# Altium footprint library Vowstar_Connector.PcbLib: 127 footprints (part 1 of 8)
Each footprint in its own frame and in the unit in brackets; x right, y up, seen from the top. Pads: shape width x height; smd on the part's side, far side on the other; paste and mask are expansions set on the pad; w line width, h text height; cw(c..) or ccw(c..) is an arc to the next point about the centre after c.
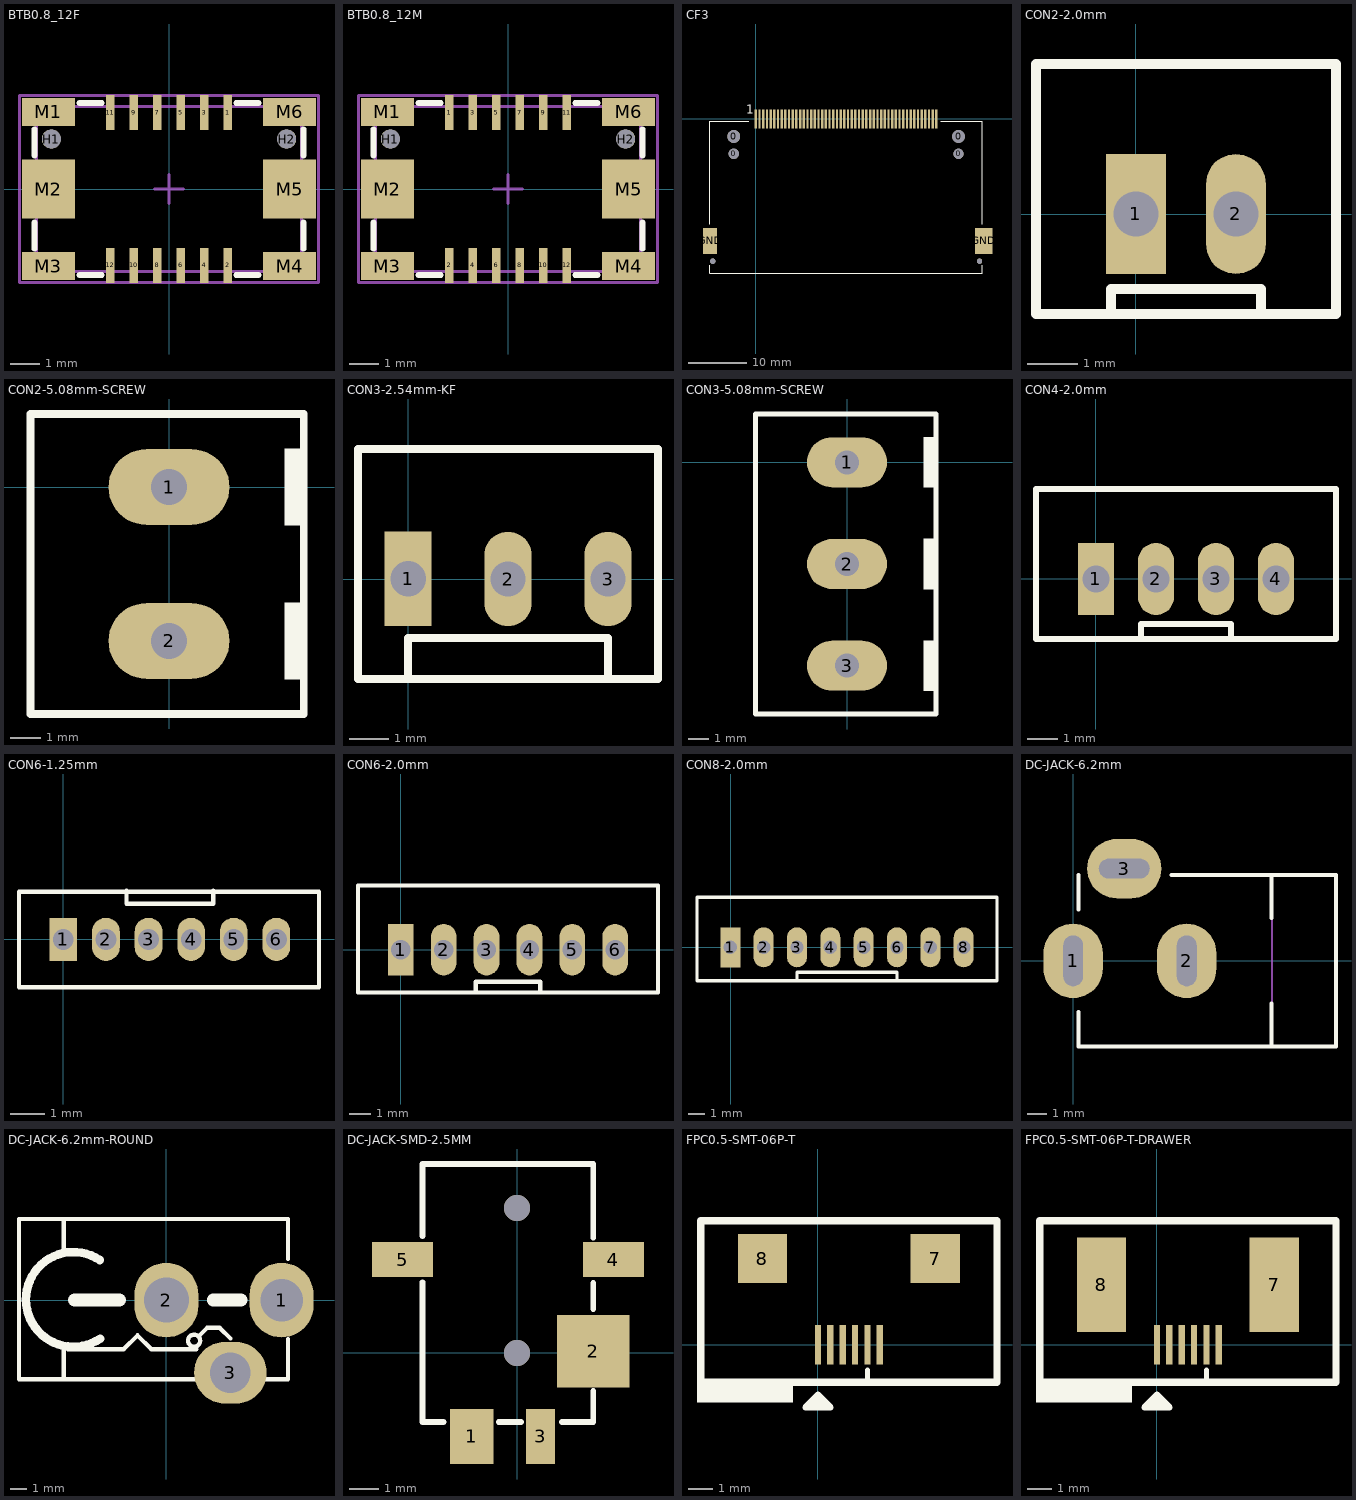
[diagram p0: the footprints below, top view; thin cyan lines are the x and y axes]

## BTB0.8_12F [mm] "BTB0.8-12M/F-6.0LG"
height 3.35
pads (20):
  rect 0.3x1.2 smd: 1(2,2.6) 2(2,-2.6) 3(1.2,2.6) 4(1.2,-2.6) 5(0.4,2.6) 6(0.4,-2.6) 7(-0.4,2.6) 8(-0.4,-2.6) 9(-1.2,2.6) 10(-1.2,-2.6) 11(-2,2.6) 12(-2,-2.6)
  round 0.65 hole 0.65 unplated mask-1: H1(-4,1.7) H2(4,1.7)
  rect 1.8x0.95 smd: M1(-4.1,2.625) M3(-4.1,-2.625) M4(4.1,-2.625) M6(4.1,2.625)
  rect 1.8x2 smd: M2(-4.1,0) M5(4.1,0)
Top Overlay:
  lines w0.2: -4.572,-2.032 -4.572,-1.143 ; -4.572,1.143 -4.572,2.032 ; -3.048,-2.921 -2.286,-2.921 ; -3.048,2.921 -2.286,2.921 ; 2.286,-2.921 3.048,-2.921 ; 2.286,2.921 3.048,2.921 ; 4.572,-2.032 4.572,-1.143 ; 4.572,1.143 4.572,2.032
Mechanical 13:
  lines w0.1: -4.5,-2.8 4.5,-2.8 4.5,2.8 -4.5,2.8 -4.5,-2.8
Mechanical 15:
  lines w0.1: -0.5,0 0.5,0 ; 0,-0.5 0,0.5 ; -5.08,-3.175 5.08,-3.175 5.08,3.175 -5.08,3.175 -5.08,-3.175
3D body "BTB0.8_12F.STEP": height 2.35, standoff -0.55, extent -4.5,-2.85 4.5,2.85

## BTB0.8_12M [mm] "BTB0.8-12M/F-6.0LG"
height 3.35
pads (20):
  rect 0.3x1.2 smd: 1(-2,2.6) 2(-2,-2.6) 3(-1.2,2.6) 4(-1.2,-2.6) 5(-0.4,2.6) 6(-0.4,-2.6) 7(0.4,2.6) 8(0.4,-2.6) 9(1.2,2.6) 10(1.2,-2.6) 11(2,2.6) 12(2,-2.6)
  round 0.65 hole 0.65 unplated mask-1: H1(-4,1.7) H2(4,1.7)
  rect 1.8x0.95 smd: M1(-4.1,2.625) M3(-4.1,-2.625) M4(4.1,-2.625) M6(4.1,2.625)
  rect 1.8x2 smd: M2(-4.1,0) M5(4.1,0)
Top Overlay:
  lines w0.2: -4.572,-2.032 -4.572,-1.143 ; -4.572,1.143 -4.572,2.032 ; -3.048,-2.921 -2.286,-2.921 ; -3.048,2.921 -2.286,2.921 ; 2.286,-2.921 3.048,-2.921 ; 2.286,2.921 3.048,2.921 ; 4.572,-2.032 4.572,-1.143 ; 4.572,1.143 4.572,2.032
Mechanical 13:
  lines w0.1: -4.5,-2.8 -4.5,2.8 4.5,2.8 4.5,-2.8 -4.5,-2.8
Mechanical 15:
  lines w0.1: -0.5,0 0.5,0 ; 0,-0.5 0,0.5 ; -5.08,-3.175 -5.08,3.175 5.08,3.175 5.08,-3.175 -5.08,-3.175
3D body "BTB0.8_12M.STEP": height 2.35, standoff -0.55, extent -4.5,-2.85 4.5,2.85

## CF3 [mm]
pads (58):
  round 0.9 hole 0.9 unplated: 0(-7.44,-24.504) 0(38.56,-24.504)
  round 1.75 hole 1.75 unplated: 0(-3.81,-6.004) 0(34.925,-6.004)
  round 2.2 hole 2.2 unplated: 0(-3.81,-3.004) 0(34.925,-3.004)
  rect 0.4x3.302 smd: 1(0,0) 2(1.27,0) 3(2.54,0) 4(3.81,0) 5(5.08,0) 6(6.35,0) 7(7.62,0) 8(8.89,0) 9(10.16,0) 10(11.43,0) 11(12.7,0) 12(13.97,0) 13(15.24,0) 14(16.51,0) 15(17.78,0) 16(19.05,0) 17(20.32,0) 18(21.59,0) 19(22.86,0) 20(24.13,0) 21(25.4,0) 22(26.67,0) 23(27.94,0) 24(29.21,0) 25(30.48,0) 26(0.635,0) 27(1.905,0) 28(3.175,0) 29(4.445,0) 30(5.715,0) 31(6.985,0) 32(8.255,0) 33(9.525,0) 34(10.795,0) 35(12.065,0) 36(13.335,0) 37(14.605,0) 38(15.875,0) 39(17.145,0) 40(18.415,0) 41(19.685,0) 42(20.955,0) 43(22.225,0) 44(23.495,0) 45(24.765,0) 46(26.035,0) 47(27.305,0) 48(28.575,0) 49(29.845,0) 50(31.115,0)
  rect 2.4x4.5 smd: GND(-7.9,-21.004)
  rect 3x4.5 smd: GND(39.31,-21.004)
Top Overlay:
  lines w0.152: -7.94,-0.404 -1.225,-0.404 ; 31.85,-0.404 39.06,-0.404
  lines w0.203: -7.94,-25.237 -7.94,-26.604 39.06,-26.604 39.06,-25.237 ; -7.94,-18.171 -7.94,-0.404 ; 39.06,-18.171 39.06,-0.404
  text "1" at -1.7,0.946 h1.52

## CON2-2.0mm [mm]
pads (2):
  rect 1.2x2.4 hole 0.9: 1(0.002,0.002)
  oval 1.2x2.4 hole 0.9: 2(2.002,0.002)
Top Overlay:
  lines w0.2: -0.498,-1.998 -0.498,-1.498 2.502,-1.498 2.502,-1.998 ; -1.998,-1.998 4.002,-1.998 4.002,3.002 -1.998,3.002 -1.998,-1.998
3D body: height 1.5, standoff 0, extent -1.905,-2.032 3.937,2.921
3D body: height 2, standoff 0, extent -0.508,-2.032 2.54,-1.905
3D body: height 5, standoff 0, extent 2.413,-2.032 4.064,-1.905
3D body: height 5, standoff 0, extent -2.032,-2.032 -0.381,-1.905
3D body: height 4, standoff -1, extent 1.778,-0.254 2.286,0.254
3D body: height 4, standoff -1, extent -0.254,-0.254 0.254,0.254
3D body: height 5, standoff 0, extent -2.032,2.921 4.064,3.048
3D body: height 5, standoff 0, extent 3.937,-1.905 4.064,3.048
3D body: height 5, standoff 0, extent -2.032,-1.905 -1.905,3.048

## CON2-5.08mm-SCREW [mm] "CON2-5.08mm-SCREW"
pads (2):
  oval 4x2.5 hole 1.2: 1(0,0) 2(0,-5.08)
Top Overlay:
  rectangle: 3.81,-6.35 4.572,-3.81
  rectangle: 3.81,-1.27 4.572,1.27
  lines w0.254: -4.572,-7.493 4.445,-7.493 4.445,2.413 -4.572,2.413 -4.572,-7.493
3D body "User Library-2 Way PCB Screw Terminal Block 5.08mm.STEP": height 15.2, standoff -3.5, extent -4.555,-7.54 4.445,2.46

## CON3-2.54mm-KF [mm]
pads (3):
  rect 1.2x2.4 hole 0.9: 1(0.002,0.002)
  oval 1.2x2.4 hole 0.9: 2(2.54,0) 3(5.08,0)
Top Overlay:
  lines w0.2: 0,-2.54 0,-1.498 5.08,-1.498 5.08,-2.54 ; -1.27,-2.54 -1.27,3.302 6.35,3.302 6.35,-2.54 -1.27,-2.54
3D body "Fan_connector(3pin).STEP": height 11.4, standoff -2, extent -1.25,-2.533 6.35,3.267

## CON3-5.08mm-SCREW [mm] "CON3-5.08mm-SCREW"
pads (3):
  oval 4x2.5 hole 1.2: 1(0,0) 2(0,-5.08) 3(0,-10.16)
Top Overlay:
  rectangle: 3.81,-11.43 4.572,-8.89
  rectangle: 3.81,-1.27 4.572,1.27
  rectangle: 3.81,-6.35 4.572,-3.81
  lines w0.254: -4.572,-12.573 -4.572,2.413 4.445,2.413 4.445,-12.573 -4.572,-12.573
3D body "User Library-3 Way PCB Screw Terminal Block 5.08mm.STEP": height 15.2, standoff -3.5, extent -4.555,-12.54 4.445,2.46

## CON4-2.0mm [mm]
pads (4):
  rect 1.2x2.4 hole 0.9: 1(0,0)
  oval 1.2x2.4 hole 0.9: 2(2,0) 3(4,0) 4(6,0)
Top Overlay:
  lines w0.2: 1.5,-2 1.5,-1.5 4.5,-1.5 4.5,-2 ; -2,-2 8,-2 8,3 -2,3 -2,-2

## CON6-1.25mm [mil]
pads (6):
  rect 32x50 hole 24: 1(0,0)
  oval 32x50 hole 24: 2(49.21,0) 3(98.42,0) 4(147.64,0) 5(196.85,0) 6(246.06,0)
Top Overlay:
  lines w5: 73.03,56.06 73.03,41.06 173.03,41.06 173.03,56.06 ; -51.18,-55.12 -51.18,55.12 295.28,55.12 295.28,-55.12 -51.18,-55.12

## CON6-2.0mm [mm]
pads (6):
  rect 1.2x2.4 hole 0.9: 1(0.008,0.002)
  oval 1.2x2.4 hole 0.9: 2(2.008,0.002) 3(4.008,0.002) 4(6.008,0.002) 5(8.008,0.002) 6(10.008,0.002)
Top Overlay:
  lines w0.2: 3.508,-1.998 3.508,-1.498 6.508,-1.498 6.508,-1.998 ; -1.992,-1.998 -1.992,3.002 12.008,3.002 12.008,-1.998 -1.992,-1.998

## CON8-2.0mm [mm]
pads (8):
  rect 1.2x2.4 hole 0.8: 1(-0.012,-0.002)
  oval 1.2x2.4 hole 0.8: 2(1.988,-0.002) 3(3.988,-0.002) 4(5.988,-0.002) 5(7.988,-0.002) 6(9.988,-0.002) 7(11.988,-0.002) 8(13.988,-0.002)
Top Overlay:
  lines w0.2: 3.988,-2.002 3.988,-1.502 9.988,-1.502 9.988,-2.002 ; -2.012,-2.002 15.988,-2.002 15.988,2.998 -2.012,2.998 -2.012,-2.002

## DC-JACK-6.2mm [mil] "DC-JACK-6.2mm"
pads (3):
  oval 120x150 hole 39.37 slot 102 at 90 deg: 1(0,0) 2(229,0)
  oval 150x120 hole 39.37 slot 102 at 0 deg: 3(103,186)
Top Overlay:
  lines w8: 11,-103 11,-173 530,-173 530,173 198,173 ; 11,103 11,173 ; 400,-173 400,-86.5 ; 400,86.5 400,173
Mechanical 13:
  lines w3.94: 401,-173 401,173
  text "PCB Edge" at 420,-145 h9.84
3D body "User Library-DC-JACK-2.5mm-10A.step": height 452.76, standoff -118.11, extent -25.75,-177.16 529.37,200.79

## DC-JACK-6.2mm-ROUND [mil] "电源插孔"
height 393.7
pads (3):
  oval 150x175 hole 100: 1(270,0)
  oval 150x175 hole 105: 2(0,0)
  oval 170x145 hole 95: 3(150,-170)
Top Overlay:
  circle w10: c65,-95 r14.14
  lines w10: -240,-185 -240,-110 ; -240,120 -240,190 ; -230,-115 -100,-115 -67.5,-82.5 -35,-115 70,-115 ; 75,-85 95,-65 125,-65 150,-90 ; 285,-91.25 285,-185 -345,-185 -345,190 285,190 285,96.25
  lines w20: -156.11,94 ccw(c-217.69,1.62) -155,-90
  lines w30: -215,0 -110,0 ; 110,0 175,0
3D body: height 433.07, standoff 0, extent -350,-185 -235,190
3D body: height 392.46, standoff 78.74, extent -340.28,-160 250.28,154.34
3D body: height 236.22, standoff 0, extent -350,-185 285,190

## DC-JACK-SMD-2.5MM [mm] "DC-JACK-SMD-2.5MM"
height 3
pads (5):
  rect 1.5x1.9 smd: 1(-1.565,-2.885)
  rect 2.5x2.5 smd: 2(2.625,0.065)
  rect 1x1.9 smd: 3(0.805,-2.885)
  rect 2.1x1.2 smd: 4(3.321,3.225) 5(-3.956,3.225)
via 0,0 diameter 0.9 hole 0.9
via 0,5 diameter 0.9 hole 0.9
Top Overlay:
  lines w0.203: -3.275,2.44 -3.275,-2.385 -2.54,-2.385 ; -3.275,4.037 -3.275,6.525 2.625,6.525 2.625,3.979 ; -0.635,-2.385 0.127,-2.385 ; 1.552,-2.385 2.625,-2.385 2.625,-1.312 ; 2.625,1.524 2.625,2.413
3D body: height 1.45, standoff 1.05, extent -1.749,6.502 -1.35,6.602
3D body: height 2.5, standoff 0, extent -2.764,6.504 -0.274,6.554
3D body: height 3, standoff 0, extent -3.302,-2.413 2.667,6.477
3D body: height 2, standoff 0, extent -1.905,-2.667 -0.889,-2.413
3D body: height 0.2, standoff 0, extent -1.905,-3.302 -0.889,-2.667
3D body: height 0.2, standoff 0, extent 0.305,-3.302 1.321,-2.667
3D body: height 2, standoff 0, extent 0.305,-2.667 1.321,-2.413
3D body: height 0.2, standoff 0, extent 2.921,2.794 3.556,3.81
3D body: height 2, standoff 0, extent 2.667,2.794 2.921,3.81
3D body: height 0.2, standoff 0, extent -4.191,2.794 -3.556,3.81
3D body: height 2, standoff 0, extent -3.556,2.794 -3.302,3.81
3D body: height 0.2, standoff 0, extent 2.921,-0.508 3.556,0.762
3D body: height 2, standoff 0, extent 2.667,-0.508 2.921,0.762

## FPC0.5-SMT-06P-T [mm] "FPC0.5-SMT-06P-T"
height 2
pads (8):
  rect 0.25x1.6 smd: 1(0,0) 2(0.5,0) 3(1,0) 4(1.5,0) 5(2,0) 6(2.5,0)
  rect 2x2 smd: 7(4.749,3.489) 8(-2.249,3.489)
Top Overlay:
  rectangle: -4.9,-2.35 -1.016,-1.5
  lines w0.2: 2,-1.525 2,-1.025
  lines w0.254: -0.302,-2.334 0.302,-2.334 0.361,-2.393 ; 0,-2.54 0,-2.032 ; 0,-2.032 0.508,-2.54 -0.508,-2.54 0,-2.032
  lines w0.3: -4.75,-1.525 -4.75,5.025 7.25,5.025 7.25,-1.525 -4.75,-1.525
3D body "User Library-FPC0.5-SMT-06P-T.step": height 1.24, standoff -0.03, extent -3.105,0.483 5.595,4.74

## FPC0.5-SMT-06P-T-DRAWER [mm] "FPC0.5-SMT-06P-T"
height 2
pads (8):
  rect 0.25x1.6 smd: 1(0,0) 2(0.5,0) 3(1,0) 4(1.5,0) 5(2,0) 6(2.5,0)
  rect 2x3.81 smd: 7(4.749,2.427) 8(-2.249,2.427)
Top Overlay:
  rectangle: -4.9,-2.349 -1.016,-1.499
  lines w0.2: 2,-1.525 2,-1.025
  lines w0.254: -0.302,-2.334 0.302,-2.334 0.361,-2.393 ; 0,-2.54 0,-2.032 ; 0,-2.032 -0.508,-2.54 0.508,-2.54 0,-2.032
  lines w0.3: -4.75,-1.525 7.25,-1.525 7.25,5.025 -4.75,5.025 -4.75,-1.525
3D body "User Library-FPC0.5-SMT-06P-T.step": height 1.24, standoff -0.03, extent -3.105,0.482 5.595,4.74